# Altium footprint library G103WM_newLib.PcbLib: 75 footprints (part 3 of 5)
Each footprint in its own frame and in the unit in brackets; x right, y up, seen from the top. Pads: shape width x height; smd on the part's side, far side on the other; paste and mask are expansions set on the pad; w line width, h text height; cw(c..) or ccw(c..) is an arc to the next point about the centre after c.
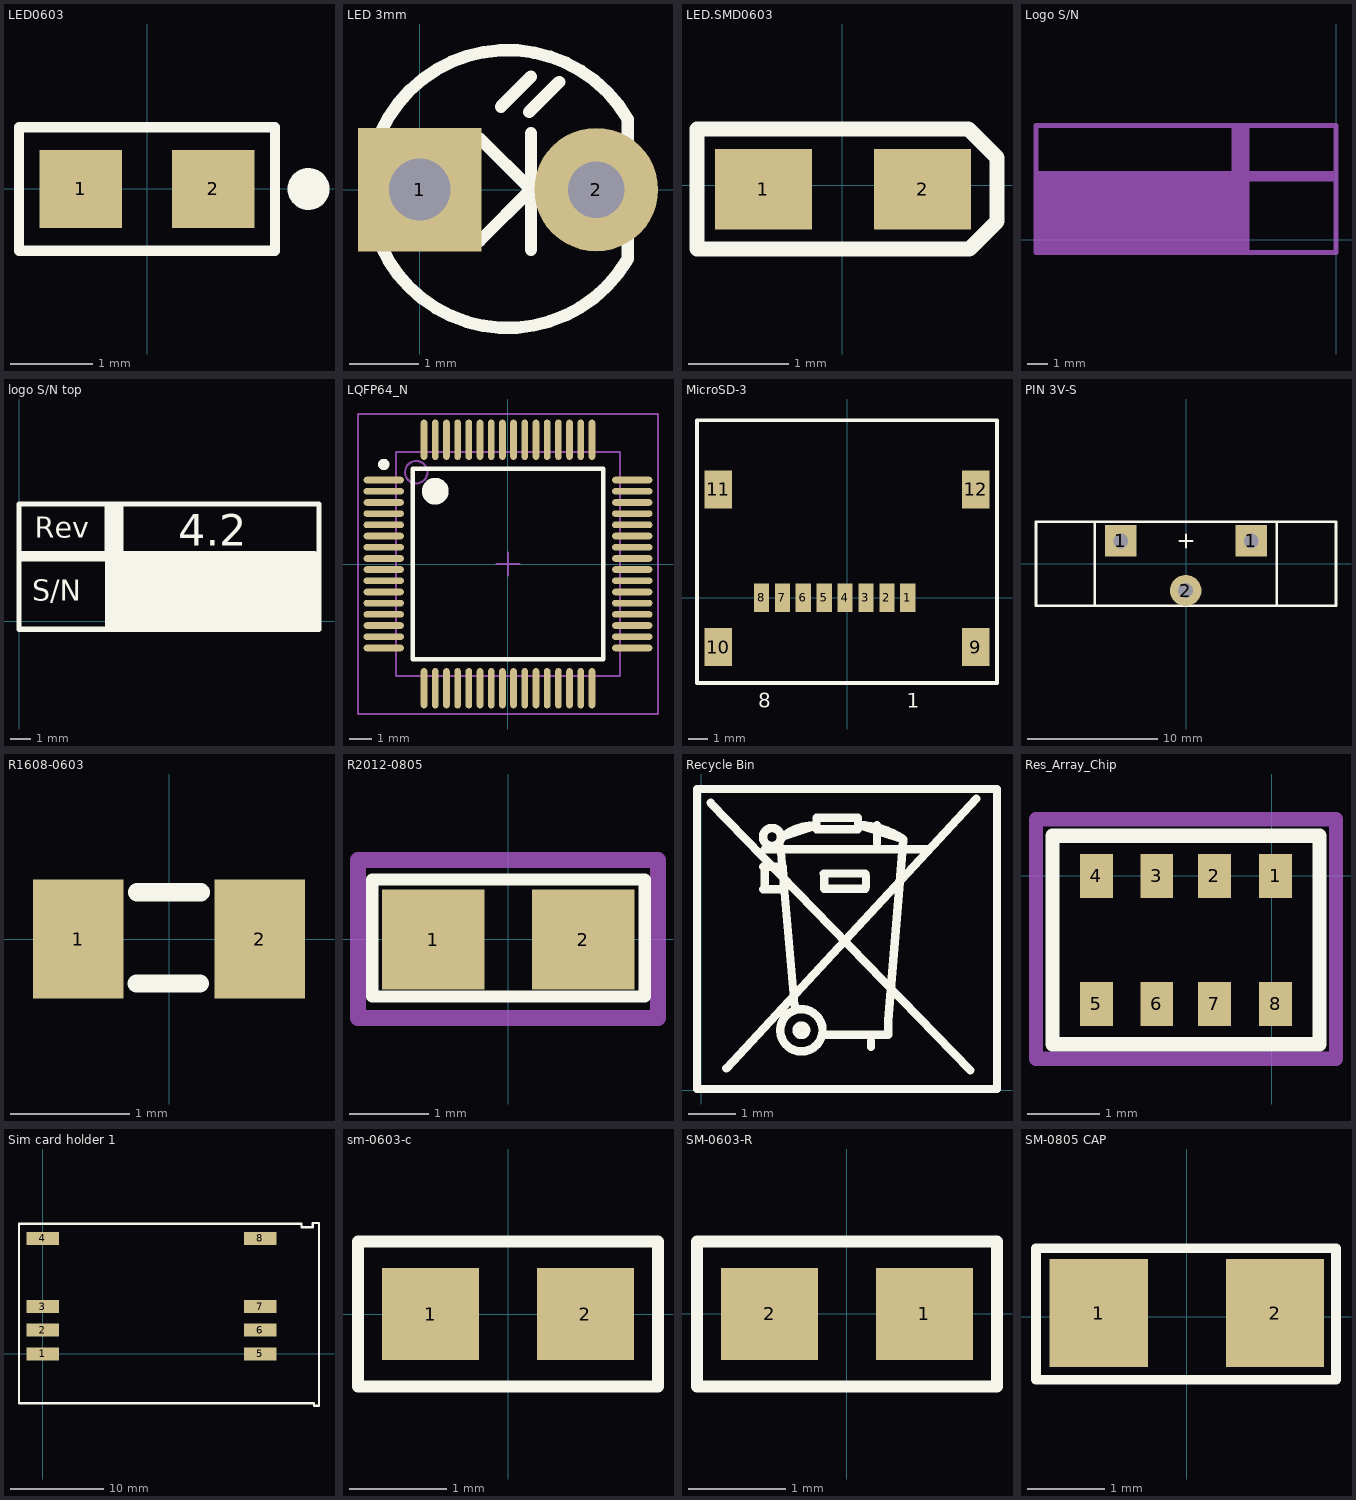
[diagram p2: the footprints below, top view; thin cyan lines are the x and y axes]

## LED0603 [mm]
pads (2):
  rect 1x0.95 smd: 1(-0.8,0) 2(0.8,0)
Top Overlay:
  circle w0.254: c1.956,0 r0.127
  lines w0.127: -1.55,-0.75 -1.55,0.75 1.55,0.75 1.55,-0.75 -1.55,-0.75
3D body "User Library-LTST-C190TBKT.STEP": height 0.9, standoff 0, extent -0.85,-0.45 0.85,0.45

## LED 3mm [mil] "LED 2 PIN, 3ly Only colour"
height 300
pads (2):
  rect 70x70 hole 35: 1(0,0)
  round 70 hole 32: 2(100,0)
Top Overlay:
  lines w7: 34,-29 63,0 34,29 ; 46,47 63,64 ; 62,44 79,61 ; 63,-34 63,32 ; 117.92,-39.35 117.92,39.84
  lines w7.01: 117.57,-39.74 cw(c49.8,0.35) 117.72,40.19
3D body "User Library-LED 3 MM_Red.STEP": height 205.33, standoff -117.51, extent -28.58,-75 108.58,81.92

## LED.SMD0603 [mm]
pads (2):
  rect 0.96x0.8 smd: 1(-0.782,-0.04) 2(0.798,-0.04)
Top Overlay:
  lines w0.152: -1.442,-0.631 -1.442,0.56 1.253,0.56 1.537,0.276 1.537,-0.356 1.263,-0.631 -1.442,-0.631

## Logo S/N [mm] "Logo S/N"
Bottom Overlay:
  rectangle: -14.981,-0.635 -4.313,3.073
  rectangle: -5.232,3.429 -4.318,5.715
  lines w0.254: -14.986,-0.635 -14.986,5.715 0,5.715 0,-0.635 -14.986,-0.635
  lines w0.508: -14.859,3.175 -0.127,3.175
  text "4.2" at -8.763,3.81 h1.52
  text "Rev" at -0.889,3.81 h1.02
  text "S/N" at -0.889,0.635 h1.02

## logo S/N top [mm]
Top Overlay:
  rectangle: 4.166,3.429 5.08,5.715
  rectangle: 4.191,-0.381 14.605,3.073
  lines w0.254: 0,-0.381 0,5.715 14.605,5.715 14.605,-0.381 0,-0.381
  lines w0.508: 0.127,3.175 14.351,3.175
  text "4.2" at 7.747,3.683 h1.52
  text "S/N" at 0.635,1.016 h1.02
  text "Rev" at 0.762,4.064 h1.02

## LQFP64_N [mm] "Thin QFP, 64-Leads, Body 10x10mm, Pitch 0.5mm, IPC Medium Density"
height 1.6
pads (64):
  oval 1.8x0.3 smd: 1(-5.55,3.75) 2(-5.55,3.25) 3(-5.55,2.75) 4(-5.55,2.25) 5(-5.55,1.75) 6(-5.55,1.25) 7(-5.55,0.75) 8(-5.55,0.25) 9(-5.55,-0.25) 10(-5.55,-0.75) 11(-5.55,-1.25) 12(-5.55,-1.75) 13(-5.55,-2.25) 14(-5.55,-2.75) 15(-5.55,-3.25) 16(-5.55,-3.75) 33(5.55,-3.75) 34(5.55,-3.25) 35(5.55,-2.75) 36(5.55,-2.25) 37(5.55,-1.75) 38(5.55,-1.25) 39(5.55,-0.75) 40(5.55,-0.25) 41(5.55,0.25) 42(5.55,0.75) 43(5.55,1.25) 44(5.55,1.75) 45(5.55,2.25) 46(5.55,2.75) 47(5.55,3.25) 48(5.55,3.75)
  oval 0.3x1.8 smd: 17(-3.75,-5.55) 18(-3.25,-5.55) 19(-2.75,-5.55) 20(-2.25,-5.55) 21(-1.75,-5.55) 22(-1.25,-5.55) 23(-0.75,-5.55) 24(-0.25,-5.55) 25(0.25,-5.55) 26(0.75,-5.55) 27(1.25,-5.55) 28(1.75,-5.55) 29(2.25,-5.55) 30(2.75,-5.55) 31(3.25,-5.55) 32(3.75,-5.55) 49(3.75,5.55) 50(3.25,5.55) 51(2.75,5.55) 52(2.25,5.55) 53(1.75,5.55) 54(1.25,5.55) 55(0.75,5.55) 56(0.25,5.55) 57(-0.25,5.55) 58(-0.75,5.55) 59(-1.25,5.55) 60(-1.75,5.55) 61(-2.25,5.55) 62(-2.75,5.55) 63(-3.25,5.55) 64(-3.75,5.55)
Top Overlay:
  circle w0.25: c-5.55,4.45 r0.125
  circle w0.6: c-3.25,3.25 r0.3
  lines w0.2: -4.25,-4.25 -4.25,4.25 4.25,4.25 4.25,-4.25 -4.25,-4.25
Mechanical 13:
  circle w0.1: c-4.1,4.1 r0.5
  lines w0.1: -5,-5 -5,5 5,5 5,-5 -5,-5
Mechanical 15:
  lines w0.1: -0.5,0 0.5,0 ; 0,-0.5 0,0.5 ; -6.7,-6.7 -6.7,6.7 6.7,6.7 6.7,-6.7 -6.7,-6.7
3D body "TQFP-G64.STEP": height 1, standoff 0, extent -5.8,-5.787 5.781,5.787

## MicroSD-3 [mm]
pads (12):
  rect 0.8x1.5 smd: 1(3.2,0) 2(2.1,0) 3(1,0) 4(-0.1,0) 5(-1.2,0) 6(-2.3,0) 7(-3.4,0) 8(-4.5,0)
  rect 1.45x2 smd: 9(6.78,-2.6) 10(-6.78,-2.6) 11(-6.78,5.7) 12(6.78,5.7)
Top Overlay:
  lines w0.2: -7.9,-4.5 -7.9,9.35 7.9,9.35 7.9,-4.5 -7.9,-4.5
  text "8" at -4.675,-5.8 h0.76
  text "1" at 3.15,-5.8 h0.76
3D body "44011.stp": height 1.77, standoff 0, extent -7.3,-4.35 7.3,9.35

## PIN 3V-S [mil] "Socket PIN 3V"
pads (3):
  rect 95x95 hole 45: 1(-196.85,68.9) 1(196.85,68.9)
  round 95 hole 45: 2(-0.98,-80.71)
Top Overlay:
  lines w7: -19.68,68.9 19.68,68.9 ; 0,49.21 0,88.58
  lines w8: -275.2,-127 -275.2,127 ; 274.02,-127 274.02,127 ; -452.76,-127 452.76,-127 452.76,127 -452.76,127 -452.76,-127
3D body "User Library-CR2032 Battery Holder-Dip180.step": height 728.62, standoff -108, extent -454.64,-125.99 454.72,125.98

## R1608-0603 [mil] "Resister Chip 0603 package"
pads (2):
  rect 30x39.37 smd: 1(-30,0.06) 2(30,0.06)
Top Overlay:
  lines w6: -10.72,-14.68 10.32,-14.68 ; -10.54,15.53 10.5,15.53
Mechanical 13:
  text ".Designator" at -57,-25 h80
3D body: height 10, standoff 0, extent -14,-16 14,16
3D body: height 12, standoff 0, extent -28,-17 -14,17
3D body: height 12, standoff 0, extent 14,-17 28,17

## R2012-0805 [mm] "Resister Chip 0805 package"
pads (2):
  rect 1.3x1.27 smd: 1(-0.945,-0.007) 2(0.955,-0.007)
Top Overlay:
  lines w0.152: -1.72,-0.731 -1.72,0.753 1.732,0.753 1.732,-0.731 -1.72,-0.731
Mechanical 13:
  lines w0.2: -1.9,-1 -1.9,1 1.9,1 1.9,-1 -1.7,-1 -1.9,-1
  text ".Designator" at -1.524,-0.635 h2.03
3D body: height 0.41, standoff 0, extent -0.889,-0.584 -0.381,0.584
3D body: height 0.41, standoff 0, extent 0.381,-0.584 0.889,0.584
3D body: height 0.38, standoff 0, extent -0.381,-0.572 0.381,0.572

## Recycle Bin [mm]
Top Overlay:
  drawing of 320 lines, arcs and shapes, not listed

## Res_Array_Chip [mil] "Res Array Chip 4xRes"
pads (8):
  rect 18x24 smd: 1(2,0) 2(-31.5,0) 3(-62.99,0) 4(-96,0) 5(-96,-70) 6(-62.99,-70) 7(-31.5,-70) 8(2,-70)
Top Overlay:
  lines w7.87: -120,-92 -120,22 26,22 26,-92 -120,-92
Mechanical 13:
  lines w7.87: -129,-100 -129,31 35,31 35,-100 -129,-100
  text ".Designator" at -3,-27 h80
3D body "Resistor Array Chip-1206-4Way.STEP": height 19.68, standoff 0, extent -110,-65.5 15.99,-2.5

## Sim card holder 1 [mm]
pads (8):
  rect 3.5x1.4 smd: 1(0,0) 2(0,2.54) 3(0,5.08) 4(0,12.4) 5(23.4,0) 6(23.4,2.54) 7(23.4,5.08) 8(23.4,12.4)
Top Overlay:
  lines w0.254: 27.838,13.64 27.838,13.97 -2.54,13.97 -2.54,-5.334 27.229,-5.334 29.185,-5.334 29.185,-5.588 29.718,-5.588 29.718,12.522 ; 27.864,13.614 29.032,13.614 29.032,14.046 29.058,14.072 29.667,14.072 ; 29.718,12.395 29.718,14.072
3D body "SIMLOCK-1.STEP": height 2.5, standoff 0, extent -1.792,-4.854 28.208,12.446

## sm-0603-c [mm] "Chip Resistor, 2-Leads, Body 1.60x0.80mm, IPC Medium Density"
height 0.6
pads (2):
  rect 1x0.95 smd: 1(-0.8,0) 2(0.8,0)
Top Overlay:
  lines w0.127: -1.55,-0.75 1.55,-0.75 1.55,0.75 -1.55,0.75 -1.55,-0.75
3D body "User Library-SMD CAPACITOR.step": height 0.8, standoff 0, extent -0.8,-0.4 0.8,0.4

## SM-0603-R [mm] "Chip Resistor, 2-Leads, Body 1.60x0.80mm, IPC Medium Density"
height 0.6
pads (2):
  rect 1x0.95 smd: 1(0.8,0) 2(-0.8,0)
Top Overlay:
  lines w0.127: -1.55,-0.75 1.55,-0.75 1.55,0.75 -1.55,0.75 -1.55,-0.75
3D body "User Library-Panasonic0603.step": height 0.45, standoff 0, extent -0.8,-0.41 0.8,0.41

## SM-0805 CAP [mil]
pads (2):
  rect 50x55 smd: 1(-45,2) 2(45,2)
Top Overlay:
  lines w5: -77,-32 76,-32 76,35 -77,35 -77,-32
3D body "SW3dPS-smt_resistor_packages.STEP": height 24.02, standoff -0.39, extent -39.76,-23 39.76,27